# Altium footprint library RL1.PCBLIB: 94 footprints (part 2 of 6)
Each footprint in its own frame and in the unit in brackets; x right, y up, seen from the top. Pads: shape width x height; smd on the part's side, far side on the other; paste and mask are expansions set on the pad; w line width, h text height; cw(c..) or ccw(c..) is an arc to the next point about the centre after c.
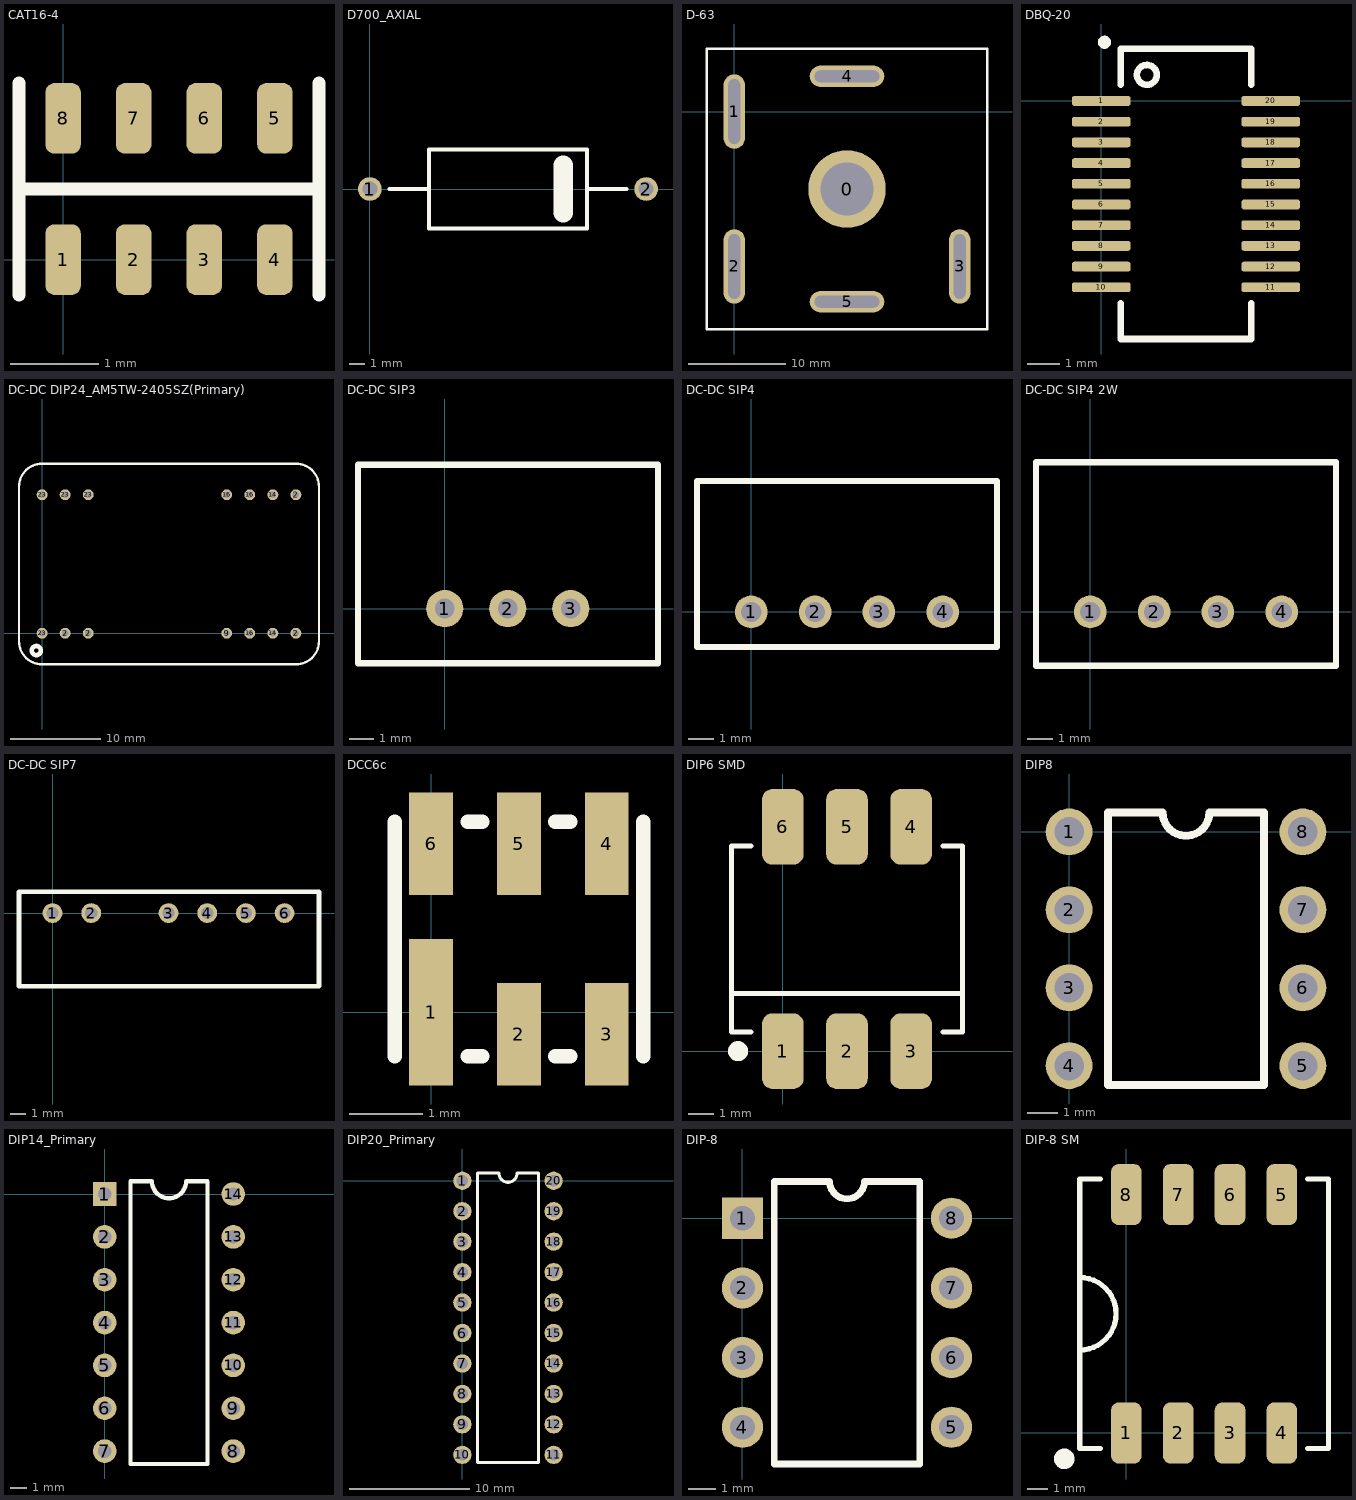
[diagram p1: the footprints below, top view; thin cyan lines are the x and y axes]

## CAT16-4 [mm]
pads (8):
  rrect50% 0.4x0.8 smd: 1(0,0) 2(0.8,0) 3(1.6,0) 4(2.4,0) 5(2.4,1.6) 6(1.6,1.6) 7(0.8,1.6) 8(0,1.6)
Top Overlay:
  lines w0.15: -0.5,-0.4 -0.5,2 ; -0.5,0.8 2.9,0.8 ; 2.9,-0.4 2.9,2
Top Assembly:
  text ".Designator" at -2.799,2.533 h0.8
3D body "User Library-Array-1206-4Way-Var1.STEP": height 0.5, standoff 0, extent -0.4,0 2.8,1.6

## D700_AXIAL [mil]
pads (2):
  round 60 hole 38: 1(0,0) 2(700,0)
Top Overlay:
  lines w10: 50,0 150,0 ; 550,0 650,0 ; 150,-100 550,-100 550,100 150,100 150,-100
  lines w50: 490,-60 490,60
Top Assembly:
  text ".Designator" at 546.79,-13.12 h39.37

## D-63 [mm]
pads (6):
  round 8 hole 5.5: 0(11.65,-8)
  oval 2.2x7.7 hole 1.2 slot 6.7 at 90 deg: 1(0,0) 2(0,-16) 3(23.3,-16)
  oval 7.7x2.2 hole 1.2 slot 6.7 at 0 deg: 4(11.65,3.65) 5(11.65,-19.65)
Top Overlay:
  lines w0.254: -2.85,-22.5 -2.85,6.5 26.15,6.5 26.15,-22.5 -2.85,-22.5
Top Assembly:
  text ".Designator" at 16.648,-8.333 h1
3D body "User Library-36MT160-1.STEP": height 10, standoff -11, extent -2.6,-22.25 25.9,6.25

## DBQ-20 [mm]
pads (20):
  rrect50% 1.8x0.3 smd: 1(0,0) 2(0,-0.635) 3(0,-1.27) 4(0,-1.905) 5(0,-2.54) 6(0,-3.175) 7(0,-3.81) 8(0,-4.445) 9(0,-5.08) 10(0,-5.715) 11(5.2,-5.715) 12(5.2,-5.08) 13(5.2,-4.445) 14(5.2,-3.81) 15(5.2,-3.175) 16(5.2,-2.54) 17(5.2,-1.905) 18(5.2,-1.27) 19(5.2,-0.635) 20(5.2,0)
Top Overlay:
  circle w0.2: c1.4,0.8 r0.304
  circle w0.2: c0.1,1.8 r0.1
  lines w0.2: 0.6,-6.2 0.6,-7.3 4.6,-7.3 4.6,-6.2 ; 0.6,0.5 0.6,1.6 4.6,1.6 4.6,0.5
Top Assembly:
  text ".Designator" at 7.598,-3.033 h1

## DC-DC DIP24_AM5TW-2405SZ(Primary) [mm]
pads (14):
  round 1.2 hole 0.7: 2(2.54,0) 2(5.08,0) 2(27.94,0) 2(27.94,15.24) 9(20.32,0) 14(25.4,0) 14(25.4,15.24) 16(20.32,15.24) 16(22.86,0) 16(22.86,15.24) 23(0,0) 23(0,15.24) 23(2.54,15.24) 23(5.08,15.24)
Top Overlay:
  circle w0.5: c-0.635,-1.905 r0.5
  lines w0.254: -2.54,-0.889 ccw(c0,-0.889) 0,-3.429 27.94,-3.429 ccw(c27.94,-0.889) 30.48,-0.889 30.48,16.129 ccw(c27.94,16.129) 27.94,18.669 0,18.669 ccw(c0,16.129) -2.54,16.129 -2.54,-0.889
Top Assembly:
  text ".Designator" at 18.968,7.287 h1
3D body "User Library-TEN3_Single output.STEP": height 10.22, standoff -5, extent -2.025,-2.525 29.975,17.775

## DC-DC SIP3 [mm]
pads (3):
  round 1.5 hole 0.8: 1(0,0) 2(2.54,0) 3(5.08,0)
Top Overlay:
  lines w0.254: -3.5,-2.2 -3.5,5.8 8.6,5.8 8.6,-2.2 -3.5,-2.2
Top Assembly:
  text ".Designator" at 7.548,1.467 h1
3D body "User Library-Traco_TSR-1-DC.STEP": height 10.2, standoff -4.1, extent -3.3,-2 8.4,5.6

## DC-DC SIP4 [mm]
pads (4):
  round 1.3 hole 0.8: 1(0,0) 2(2.54,0) 3(5.08,0) 4(7.62,0)
Top Overlay:
  lines w0.254: -2.159,-1.397 -2.159,5.207 9.779,5.207 9.779,-1.397 -2.159,-1.397
Top Assembly:
  text ".Designator" at 8.808,1.572 h1
3D body "SW3dPS-DCDCSIL4.STEP": height 10.17, standoff -2.49, extent -2.05,-1.32 9.65,4.78

## DC-DC SIP4 2W [mm]
pads (4):
  round 1.3 hole 0.8: 1(0,0) 2(2.54,0) 3(5.08,0) 4(7.62,0)
Top Overlay:
  lines w0.254: -2.16,-2.15 -2.16,5.96 9.78,5.96 9.78,-2.15 -2.16,-2.15
Top Assembly:
  text ".Designator" at 8.808,1.572 h1

## DC-DC SIP7 [mm]
pads (6):
  round 1.3 hole 0.8: 1(0,0) 2(2.54,0) 3(7.62,0) 4(10.16,0) 5(12.7,0) 6(15.24,0)
Top Overlay:
  lines w0.3: -2.2,-4.8 -2.2,1.4 17.5,1.4 17.5,-4.8 -2.2,-4.8
Top Assembly:
  text ".Designator" at 12.648,-2.033 h1

## DCC6c [mm]
pads (6):
  rect 0.6x2 smd: 1(0,0)
  rect 0.6x1.4 smd: 2(1.2,-0.3) 3(2.4,-0.3) 4(2.4,2.3) 5(1.2,2.3) 6(0,2.3)
Top Overlay:
  lines w0.2: -0.5,-0.6 -0.5,2.6 ; 0.5,-0.6 0.7,-0.6 ; 0.5,2.6 0.7,2.6 ; 1.7,-0.6 1.9,-0.6 ; 1.7,2.6 1.9,2.6 ; 2.9,-0.6 2.9,2.6
Top Assembly:
  text ".Designator" at 6.198,0.667 h1
3D body "DCC6C.STEP": height 1.14, standoff -0.09, extent -0.3,-0.5 2.7,2.5

## DIP6 SMD [mm]
pads (6):
  rrect50% 1.65x3 smd: 1(0,0) 2(2.54,0) 3(5.08,0) 4(5.08,8.89) 5(2.54,8.89) 6(0,8.89)
Top Overlay:
  circle w0.4: c-1.778,0 r0.2
  lines w0.2: -2.032,2.286 7.112,2.286 ; -1.27,0.762 -2.032,0.762 -2.032,8.128 -1.27,8.128 ; 6.35,0.762 7.112,0.762 7.112,8.128 6.35,8.128
Top Assembly:
  text ".Designator" at -2.498,4.167 h1
3D body "User Library-N06C.STEP": height 3.82, standoff 0, extent -1.016,-0.495 6.104,9.385

## DIP8 [mil]
pads (8):
  round 60 hole 38: 1(0,0) 2(0,-100) 3(0,-200) 4(0,-300) 5(300,-300) 6(300,-200) 7(300,-100) 8(300,0)
Top Overlay:
  lines w10: 50,-325 50,25 120,25 ccw(c150,25) 180,25 250,25 250,-325 50,-325
Top Assembly:
  text ".Designator" at 346.79,-163.12 h39.37

## DIP14_Primary [mm]
pads (14):
  rect 1.4x1.4 hole 0.8: 1(0,0)
  round 1.4 hole 0.8: 2(0,-2.54) 3(0,-5.08) 4(0,-7.62) 5(0,-10.16) 6(0,-12.7) 7(0,-15.24) 8(7.62,-15.24) 9(7.62,-12.7) 10(7.62,-10.16) 11(7.62,-7.62) 12(7.62,-5.08) 13(7.62,-2.54) 14(7.62,0)
Top Overlay:
  lines w0.254: 1.524,-16.002 6.096,-16.002 6.096,0.762 4.826,0.762 cw(c3.81,0.762) 2.794,0.762 1.524,0.762 1.524,-16.002
Top Assembly:
  text ".Designator" at 8.808,-7.953 h1

## DIP20_Primary [mil]
pads (20):
  round 60 hole 38: 1(0,0) 2(0,-100) 3(0,-200) 4(0,-300) 5(0,-400) 6(0,-500) 7(0,-600) 8(0,-700) 9(0,-800) 10(0,-900) 11(300,-900) 12(300,-800) 13(300,-700) 14(300,-600) 15(300,-500) 16(300,-400) 17(300,-300) 18(300,-200) 19(300,-100) 20(300,0)
Top Overlay:
  lines w10: 50,-925 250,-925 250,25 180,25 cw(c150,25) 120,25 50,25 50,-925
Top Assembly:
  text ".Designator" at 346.79,-463.12 h39.37

## DIP-8 [mm]
pads (8):
  rect 1.5x1.5 hole 0.9: 1(0,0)
  round 1.5 hole 0.9: 2(0,-2.54) 3(0,-5.08) 4(0,-7.62) 5(7.62,-7.62) 6(7.62,-5.08) 7(7.62,-2.54) 8(7.62,0)
Top Overlay:
  lines w0.25: 1.16,-8.96 6.46,-8.96 6.46,1.34 4.445,1.34 cw(c3.81,1.34) 3.175,1.34 1.16,1.34 1.16,-8.96
Top Assembly:
  text ".Designator" at 8.808,-4.143 h1

## DIP-8 SM [mm]
pads (8):
  rrect50% 1.5x3 smd: 1(0,0) 2(2.54,0) 3(5.08,0) 4(7.62,0) 5(7.62,11.684) 6(5.08,11.684) 7(2.54,11.684) 8(0,11.684)
Top Overlay:
  circle w0.5: c-3.048,-1.27 r0.254
  lines w0.254: -2.286,4.064 ccw(c-2.286,5.842) -2.286,7.62 ; -1.27,-0.762 -2.286,-0.762 -2.286,12.446 -1.27,12.446 ; 8.89,-0.762 9.906,-0.762 9.906,12.446 8.89,12.446
Top Assembly:
  text ".Designator" at 8.239,5.423 h1
3D body "User Library-HCNR200_SMD.STEP": height 4.75, standoff 0, extent -1.778,-0.308 9.372,11.992